# Altium footprint library 3.13-M3铜柱-散热片.PcbLib: 151 footprints (part 9 of 10)
Each footprint in its own frame and in the unit in brackets; x right, y up, seen from the top. Pads: shape width x height; smd on the part's side, far side on the other; paste and mask are expansions set on the pad; w line width, h text height; cw(c..) or ccw(c..) is an arc to the next point about the centre after c.
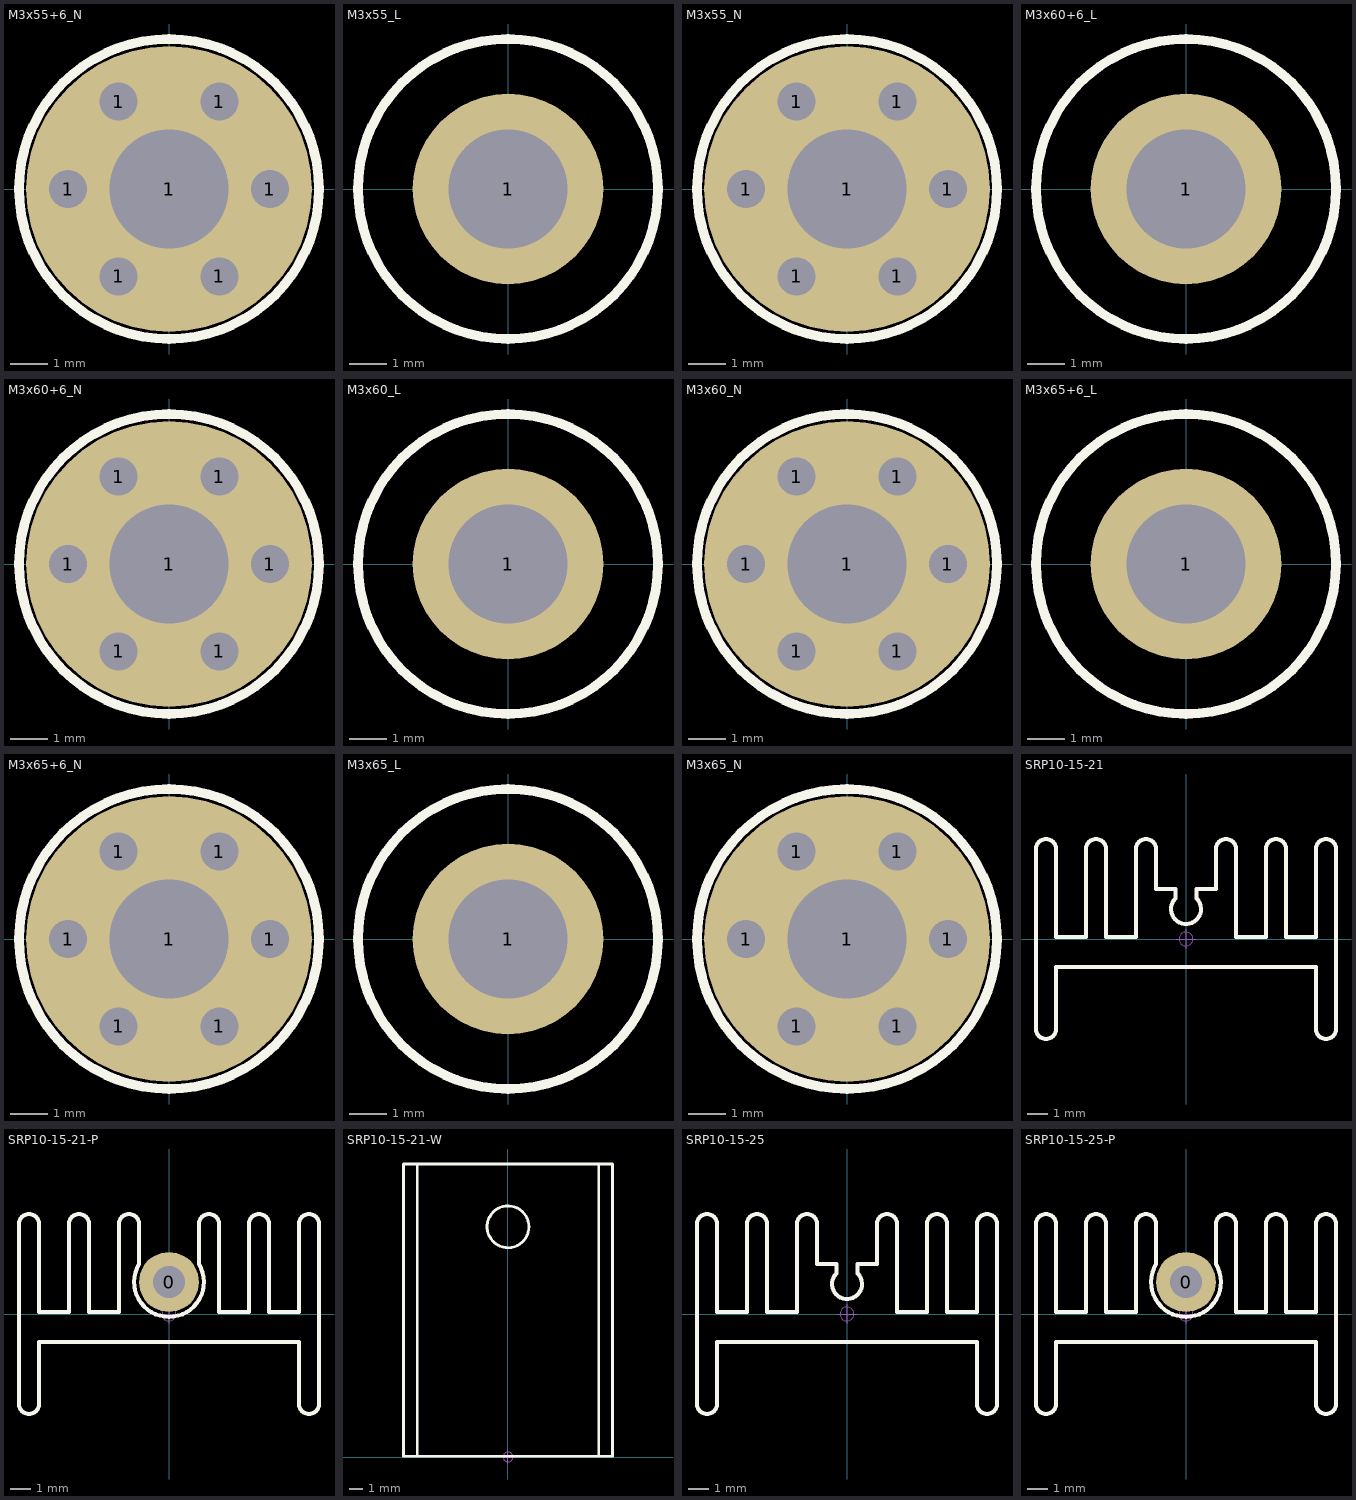
[diagram p8: the footprints below, top view; thin cyan lines are the x and y axes]

## M3x55+6_N [mil] "M3铜柱，长：55mm，螺纹长：6mm"
pads (7):
  round 40 hole 40: 1(-106,0) 1(-53,-91.8) 1(-53,91.8) 1(53,-91.8) 1(53,91.8) 1(106,0)
  round 300 hole 125: 1(0,0)
Top Overlay:
  circle w10: c0,0 r157.48
3D body: height 2167.36, standoff -234.25, extent -106.22,-92.52 106.22,92.52

## M3x55_L [mil] "M3铜柱，长：55mm"
pads (1):
  round 200 hole 125: 1(0,0)
Top Overlay:
  circle w10: c0,0 r157.48
3D body: height 2167.33, standoff 1.96, extent -106.22,-92.52 106.22,92.52

## M3x55_N [mil] "M3铜柱，长：55mm"
pads (7):
  round 40 hole 40: 1(-106,0) 1(-53,-91.8) 1(-53,91.8) 1(53,-91.8) 1(53,91.8) 1(106,0)
  round 300 hole 125: 1(0,0)
Top Overlay:
  circle w10: c0,0 r157.48
3D body: height 2167.33, standoff 1.96, extent -106.22,-92.52 106.22,92.52

## M3x60+6_L [mil] "M3铜柱，长：60mm，螺纹长：6mm"
pads (1):
  round 200 hole 125: 1(0,0)
Top Overlay:
  circle w10: c0,0 r157.48
3D body: height 2364.18, standoff -234.25, extent -106.22,-92.52 106.22,92.52

## M3x60+6_N [mil] "M3铜柱，长：60mm，螺纹长：6mm"
pads (7):
  round 40 hole 40: 1(-106,0) 1(-53,-91.8) 1(-53,91.8) 1(53,-91.8) 1(53,91.8) 1(106,0)
  round 300 hole 125: 1(0,0)
Top Overlay:
  circle w10: c0,0 r157.48
3D body: height 2364.18, standoff -234.25, extent -106.22,-92.52 106.22,92.52

## M3x60_L [mil] "M3铜柱，长：60mm"
pads (1):
  round 200 hole 125: 1(0,0)
Top Overlay:
  circle w10: c0,0 r157.48
3D body: height 2364.18, standoff 1.96, extent -106.22,-92.52 106.22,92.52

## M3x60_N [mil] "M3铜柱，长：60mm"
pads (7):
  round 40 hole 40: 1(-106,0) 1(-53,-91.8) 1(-53,91.8) 1(53,-91.8) 1(53,91.8) 1(106,0)
  round 300 hole 125: 1(0,0)
Top Overlay:
  circle w10: c0,0 r157.48
3D body: height 2364.18, standoff 1.96, extent -106.22,-92.52 106.22,92.52

## M3x65+6_L [mil] "M3铜柱，长：65mm，螺纹长：6mm"
pads (1):
  round 200 hole 125: 1(0,0)
Top Overlay:
  circle w10: c0,0 r157.48
3D body: height 2561.03, standoff -234.25, extent -106.22,-92.52 106.22,92.52

## M3x65+6_N [mil] "M3铜柱，长：65mm，螺纹长：6mm"
pads (7):
  round 40 hole 40: 1(-106,0) 1(-53,-91.8) 1(-53,91.8) 1(53,-91.8) 1(53,91.8) 1(106,0)
  round 300 hole 125: 1(0,0)
Top Overlay:
  circle w10: c0,0 r157.48
3D body: height 2561.03, standoff -234.25, extent -106.22,-92.52 106.22,92.52

## M3x65_L [mil] "M3铜柱，长：65mm"
pads (1):
  round 200 hole 125: 1(0,0)
Top Overlay:
  circle w10: c0,0 r157.48
3D body: height 2561.03, standoff 1.96, extent -106.22,-92.52 106.22,92.52

## M3x65_N [mil] "M3铜柱，长：65mm"
pads (7):
  round 40 hole 40: 1(-106,0) 1(-53,-91.8) 1(-53,91.8) 1(53,-91.8) 1(53,91.8) 1(106,0)
  round 300 hole 125: 1(0,0)
Top Overlay:
  circle w10: c0,0 r157.48
3D body: height 2561.03, standoff 1.96, extent -106.22,-92.52 106.22,92.52

## SRP10-15-21 [mil] "10mm*15mm*21mm(长*宽*高)"
Top Overlay:
  lines w8: -295.28,-177.17 ccw(c-275.59,-177.17) -255.91,-177.17 -255.91,-55.12 255.91,-55.12 255.91,-177.17 ccw(c275.59,-177.17) 295.28,-177.17 295.28,177.17 ccw(c275.59,177.17) 255.91,177.17 255.91,3.94 196.85,3.94 196.85,177.17 ccw(c177.17,177.17) 157.48,177.17 157.48,3.94 98.43,3.94 98.43,177.17 ccw(c78.74,177.17) 59.06,177.17 59.06,98.17 21,98.17 21,79.77 21.85,78.92 cw(c0,59.06) -20.91,79.91 -21,80 -21,98.17 -59.06,98.17 -59.06,177.17 ccw(c-78.74,177.17) -98.43,177.17 -98.43,3.94 -157.48,3.94 -157.48,177.17 ccw(c-177.17,177.17) -196.85,177.17 -196.85,3.94 -255.91,3.94 -255.91,177.17 ccw(c-275.59,177.17) -295.28,177.17 -295.28,-177.17
Mechanical 15:
  circle w1.97: c0,0 r13.78
  lines w1.97: -19.68,0 19.68,0 ; 0,-19.68 0,19.68
3D body: height 828.74, standoff 1.97, extent -295.27,-196.84 295.29,196.86

## SRP10-15-21-P [mm] "10mm*15mm*21mm(长*宽*高)"
pads (1):
  round 3 hole 1.6 unplated: 0(0,1.6)
Top Overlay:
  lines w0.203: -7.5,-4.5 ccw(c-7,-4.5) -6.5,-4.5 -6.5,-1.4 6.5,-1.4 6.5,-4.5 ccw(c7,-4.5) 7.5,-4.5 7.5,4.5 ccw(c7,4.5) 6.5,4.5 6.5,0.1 5,0.1 5,4.5 ccw(c4.5,4.5) 4,4.5 4,0.1 2.5,0.1 2.5,4.5 ccw(c2,4.5) 1.5,4.5 1.5,2.494 cw(c0,1.6) -1.5,2.494 -1.5,4.5 ccw(c-2,4.5) -2.5,4.5 -2.5,0.1 -4,0.1 -4,4.5 ccw(c-4.5,4.5) -5,4.5 -5,0.1 -6.5,0.1 -6.5,4.5 ccw(c-7,4.5) -7.5,4.5 -7.5,-4.5
Mechanical 15:
  circle w0.05: c0,0 r0.35
  lines w0.05: -0.5,0 0.5,0 ; 0,-0.5 0,0.5
3D body: height 21.05, standoff -3.45, extent -7.5,-5.146 7.5,4.854

## SRP10-15-21-W [mil] "10mm*15mm*21mm(长*宽*高)"
Top Overlay:
  circle w8: c0,649.61 r59.06
  lines w8: -255.91,1.96 -255.91,826.77 ; 255.91,1.96 255.91,826.77 ; -295.27,1.96 -295.27,826.77 295.28,826.77 295.28,1.96 -295.27,1.96
Mechanical 15:
  circle w1.97: c0,0 r13.78
  lines w1.97: -19.68,0 19.68,0 ; 0,-19.68 0,19.68
3D body: height 395.67, standoff 1.97, extent -295.28,3.92 295.27,830.7

## SRP10-15-25 [mil] "10mm*15mm*25mm(长*宽*高)"
Top Overlay:
  lines w8: -295.28,-177.17 ccw(c-275.59,-177.17) -255.91,-177.17 -255.91,-55.12 255.91,-55.12 255.91,-177.17 ccw(c275.59,-177.17) 295.28,-177.17 295.28,177.17 ccw(c275.59,177.17) 255.91,177.17 255.91,3.94 196.85,3.94 196.85,177.17 ccw(c177.17,177.17) 157.48,177.17 157.48,3.94 98.43,3.94 98.43,177.17 ccw(c78.74,177.17) 59.06,177.17 59.06,98.17 21,98.17 21,79.77 21.85,78.92 cw(c0,59.06) -20.91,79.91 -21,80 -21,98.17 -59.06,98.17 -59.06,177.17 ccw(c-78.74,177.17) -98.43,177.17 -98.43,3.94 -157.48,3.94 -157.48,177.17 ccw(c-177.17,177.17) -196.85,177.17 -196.85,3.94 -255.91,3.94 -255.91,177.17 ccw(c-275.59,177.17) -295.28,177.17 -295.28,-177.17
Mechanical 15:
  circle w1.97: c0,0 r13.78
  lines w1.97: -19.68,0 19.68,0 ; 0,-19.68 0,19.68
3D body: height 990.16, standoff 5.91, extent -295.28,-196.85 295.28,196.85

## SRP10-15-25-P [mm] "10mm*15mm*25mm(长*宽*高)"
pads (1):
  round 3 hole 1.6 unplated: 0(0,1.6)
Top Overlay:
  lines w0.203: -7.5,-4.5 ccw(c-7,-4.5) -6.5,-4.5 -6.5,-1.4 6.5,-1.4 6.5,-4.5 ccw(c7,-4.5) 7.5,-4.5 7.5,4.5 ccw(c7,4.5) 6.5,4.5 6.5,0.1 5,0.1 5,4.5 ccw(c4.5,4.5) 4,4.5 4,0.1 2.5,0.1 2.5,4.5 ccw(c2,4.5) 1.5,4.5 1.5,2.494 cw(c0,1.6) -1.5,2.494 -1.5,4.5 ccw(c-2,4.5) -2.5,4.5 -2.5,0.1 -4,0.1 -4,4.5 ccw(c-4.5,4.5) -5,4.5 -5,0.1 -6.5,0.1 -6.5,4.5 ccw(c-7,4.5) -7.5,4.5 -7.5,-4.5
Mechanical 15:
  circle w0.05: c0,0 r0.35
  lines w0.05: -0.5,0 0.5,0 ; 0,-0.5 0,0.5
3D body: height 25.05, standoff -3.45, extent -7.5,-5.019 7.5,4.981